# Altium footprint library User.PcbLib: 317 footprints (part 8 of 20)
Each footprint in its own frame and in the unit in brackets; x right, y up, seen from the top. Pads: shape width x height; smd on the part's side, far side on the other; paste and mask are expansions set on the pad; w line width, h text height; cw(c..) or ccw(c..) is an arc to the next point about the centre after c.
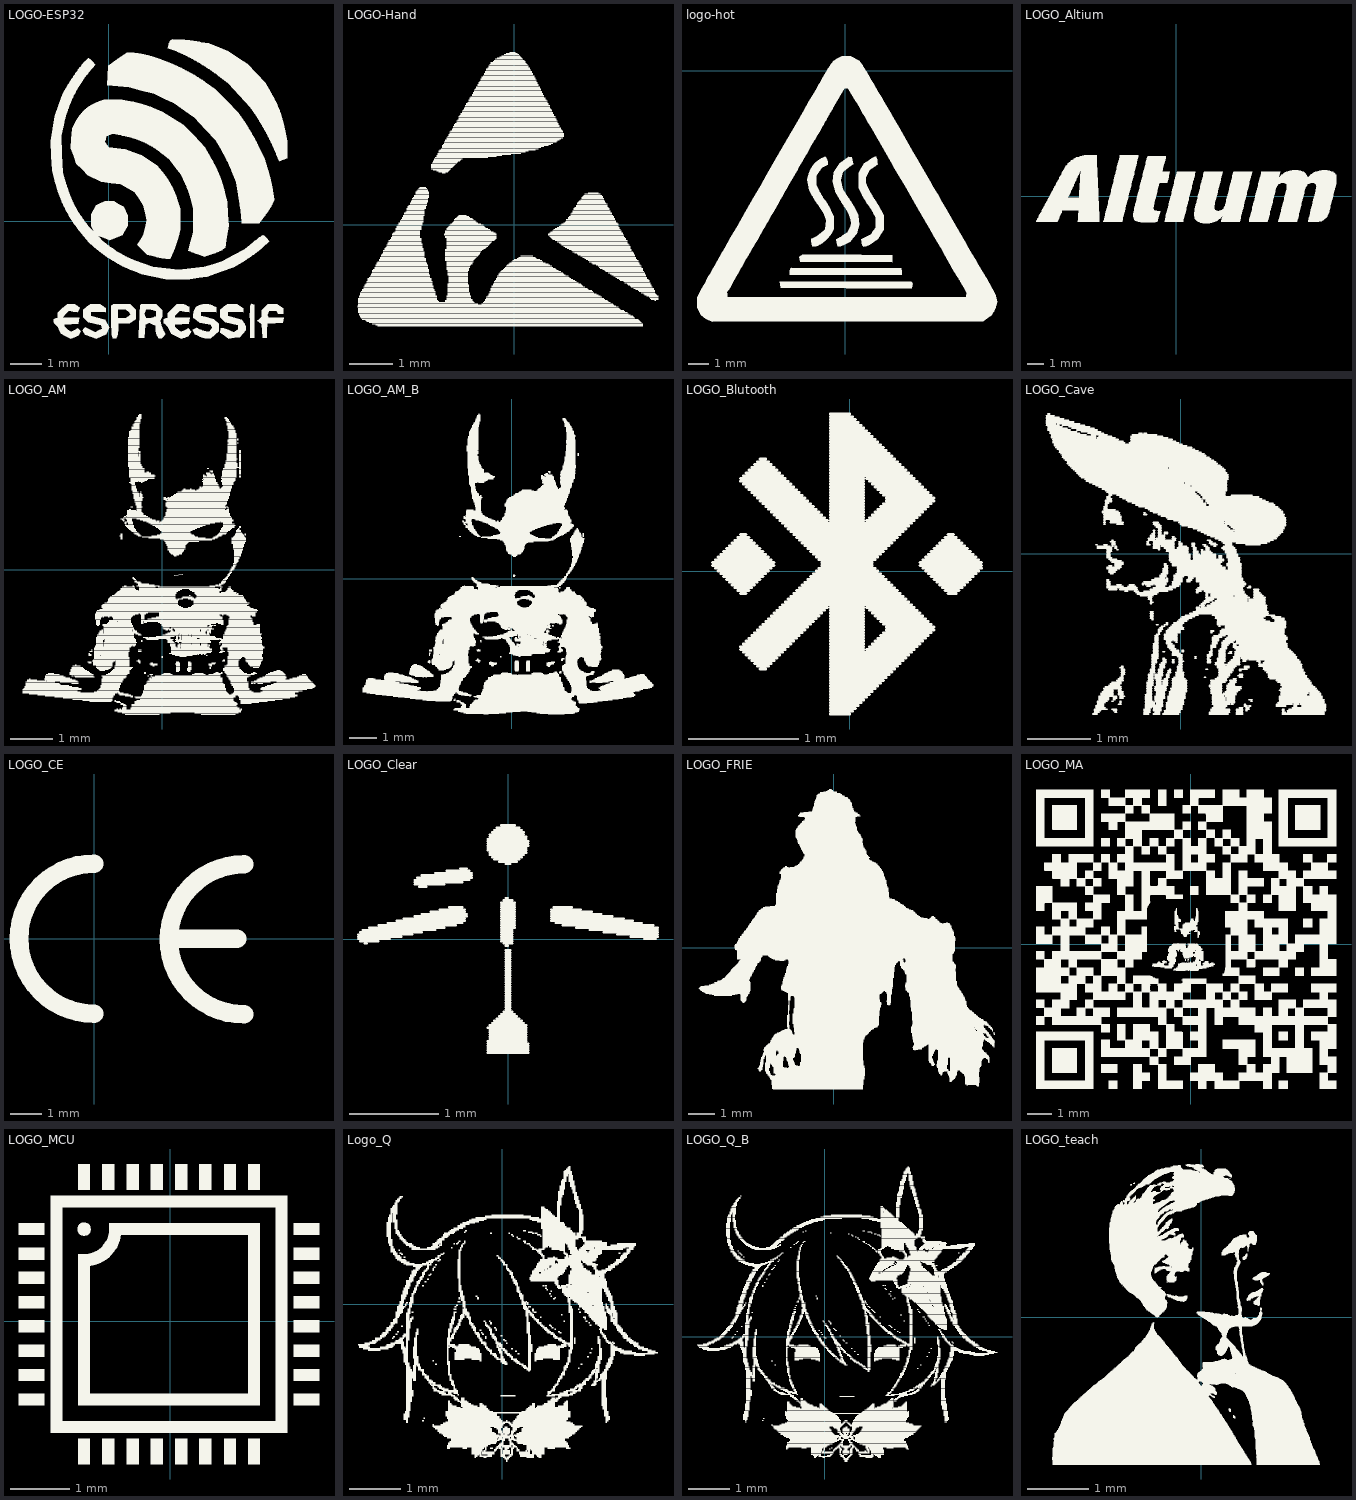
[diagram p7: the footprints below, top view; thin cyan lines are the x and y axes]

## LOGO-ESP32 [mm]
Top Overlay:
  drawing of 13 lines, arcs and shapes, not listed

## LOGO-Hand [mm]
Top Overlay:
  drawing of 457 lines, arcs and shapes, not listed

## logo-hot [mm]
Top Overlay:
  drawing of 7 lines, arcs and shapes, not listed

## LOGO_Altium [mm]
Top Overlay:
  drawing of 1243 lines, arcs and shapes, not listed

## LOGO_AM [mm]
Top Overlay:
  drawing of 1007 lines, arcs and shapes, not listed

## LOGO_AM_B [mm]
Top Overlay:
  drawing of 1423 lines, arcs and shapes, not listed

## LOGO_Blutooth [mm]
Top Overlay:
  drawing of 230 lines, arcs and shapes, not listed

## LOGO_Cave [mm]
Top Overlay:
  drawing of 789 lines, arcs and shapes, not listed

## LOGO_CE [mm]
Top Overlay:
  lines w0.6: 0,-2.413 cw(c0,0) 0,2.413 ; 2.53,0 4.6,0 ; 4.826,-2.438 cw(c4.826,-0.025) 4.826,2.388

## LOGO_Clear [mm]
Top Overlay:
  lines w0.025: -1.676,0 -1.321,0 ; -1.676,0.025 -1.194,0.025 ; -1.676,0.051 -1.067,0.051 ; -1.651,-0.025 -1.448,-0.025 ; -1.651,0.076 -0.965,0.076 ; -1.626,0.102 -0.813,0.102 ; -1.6,-0.051 -1.575,-0.051 ; -1.549,0.127 -0.711,0.127 ; -1.448,0.152 -0.584,0.152 ; -1.346,0.178 -0.508,0.178 ; -1.245,0.203 -0.483,0.203 ; -1.168,0.229 -0.483,0.229 ; -1.041,0.254 -0.457,0.254 ; -1.041,0.61 -0.711,0.61 ; -1.041,0.635 -0.508,0.635 ; -1.041,0.66 -0.432,0.66 ; -1.016,0.686 -0.406,0.686 ; -0.991,0.584 -0.914,0.584 ; -0.965,0.279 -0.457,0.279 ; -0.965,0.711 -0.406,0.711 ; -0.864,0.305 -0.483,0.305 ; -0.813,0.737 -0.406,0.737 ; -0.762,0.33 -0.483,0.33 ; -0.686,0.762 -0.432,0.762 ; -0.66,0.356 -0.508,0.356 ; -0.533,0.787 -0.457,0.787 ; -0.229,-1.27 0.229,-1.27 ; -0.229,-1.245 0.229,-1.245 ; -0.229,-1.219 0.229,-1.219 ; -0.229,-1.194 0.229,-1.194 ; -0.229,-1.168 0.229,-1.168 ; -0.229,-1.143 0.203,-1.143 ; -0.229,-0.991 0.203,-0.991 ; -0.229,0.991 0.203,0.991 ; -0.229,1.016 0.203,1.016 ; -0.229,1.041 0.229,1.041 ; -0.229,1.067 0.229,1.067 ; -0.229,1.092 0.229,1.092 ; -0.229,1.118 0.203,1.118 ; -0.203,-1.118 0.203,-1.118 ; -0.203,-1.092 0.203,-1.092 ; -0.203,-1.067 0.203,-1.067 ; -0.203,-1.041 0.203,-1.041 ; -0.203,-1.016 0.203,-1.016 ; -0.203,-0.965 0.203,-0.965 ; -0.203,0.94 0.178,0.94 ; -0.203,0.965 0.203,0.965 ; -0.203,1.143 0.203,1.143 ; -0.203,1.168 0.178,1.168 ; -0.178,-0.94 0.178,-0.94 ; -0.178,0.914 0.152,0.914 ; -0.178,1.194 0.178,1.194 ; -0.152,-0.914 0.152,-0.914 ; -0.152,0.889 0.127,0.889 ; -0.152,1.219 0.152,1.219 ; -0.127,-0.889 0.127,-0.889 ; -0.127,1.245 0.127,1.245 ; -0.102,-0.864 0.102,-0.864 ; -0.102,0.864 0.102,0.864 ; -0.076,-0.838 0.076,-0.838 ; -0.076,-0.025 0.051,-0.025 ; -0.076,0 0.051,0 ; -0.076,0.025 0.051,0.025 ; -0.076,0.051 0.051,0.051 ; -0.076,0.076 0.051,0.076 ; -0.076,0.102 0.051,0.102 ; -0.076,0.127 0.076,0.127 ; -0.076,0.152 0.076,0.152 ; -0.076,0.178 0.076,0.178 ; -0.076,0.203 0.076,0.203 ; -0.076,0.229 0.076,0.229 ; -0.076,0.254 0.076,0.254 ; -0.076,0.279 0.076,0.279 ; -0.076,0.305 0.076,0.305 ; -0.076,0.33 0.076,0.33 ; -0.076,0.356 0.076,0.356 ; -0.076,0.381 0.076,0.381 ; -0.076,0.406 0.076,0.406 ; -0.076,1.27 0.076,1.27 ; -0.051,-0.813 0.051,-0.813 ; -0.051,-0.051 0.051,-0.051 ; -0.051,0.432 0.051,0.432 ; -0.025,-0.787 0.025,-0.787 ; -0.025,-0.762 0.025,-0.762 ; -0.025,-0.737 0.025,-0.737 ; -0.025,-0.711 0.025,-0.711 ; -0.025,-0.686 0.025,-0.686 ; -0.025,-0.66 0.025,-0.66 ; -0.025,-0.635 0.025,-0.635 ; -0.025,-0.61 0.025,-0.61 ; -0.025,-0.584 0.025,-0.584 ; -0.025,-0.559 0.025,-0.559 ; -0.025,-0.533 0.025,-0.533 ; -0.025,-0.508 0.025,-0.508 ; -0.025,-0.483 0.025,-0.483 ; -0.025,-0.457 0.025,-0.457 ; -0.025,-0.432 0.025,-0.432 ; -0.025,-0.406 0.025,-0.406 ; -0.025,-0.381 0.025,-0.381 ; -0.025,-0.356 0.025,-0.356 ; -0.025,-0.33 0.025,-0.33 ; -0.025,-0.305 0.025,-0.305 ; -0.025,-0.279 0.025,-0.279 ; -0.025,-0.254 0.025,-0.254 ; -0.025,-0.229 0.025,-0.229 ; -0.025,-0.203 0.025,-0.203 ; -0.025,-0.178 0.025,-0.178 ; -0.025,-0.152 0.025,-0.152 ; -0.025,-0.127 0.025,-0.127 ; -0.025,-0.076 0,-0.076 ; -0.025,0.457 0,0.457 ; -0.025,0.838 0.025,0.838 ; 0.483,0.203 1.397,0.203 ; 0.483,0.229 1.295,0.229 ; 0.483,0.254 1.168,0.254 ; 0.483,0.279 1.041,0.279 ; 0.483,0.305 0.94,0.305 ; 0.483,0.33 0.813,0.33 ; 0.508,0.356 0.711,0.356 ; 0.533,0.178 1.499,0.178 ; 0.61,0.152 1.626,0.152 ; 0.762,0.127 1.676,0.127 ; 0.914,0.102 1.676,0.102 ; 1.067,0.076 1.676,0.076 ; 1.219,0.051 1.676,0.051 ; 1.372,0.025 1.676,0.025 ; 1.524,0 1.651,0

## LOGO_FRIE [mm]
Top Overlay:
  drawing of 1037 lines, arcs and shapes, not listed

## LOGO_MA [mm]
Top Overlay:
  drawing of 4503 lines, arcs and shapes, not listed

## LOGO_MCU [mm]
Top Overlay:
  drawing of 2655 lines, arcs and shapes, not listed

## Logo_Q [mm]
Top Overlay:
  drawing of 1636 lines, arcs and shapes, not listed

## LOGO_Q_B [mm]
Top Overlay:
  drawing of 2089 lines, arcs and shapes, not listed

## LOGO_teach [mm]
Top Overlay:
  drawing of 2705 lines, arcs and shapes, not listed